# Altium footprint library devices.PCBLIB: 335 footprints (part 18 of 21)
Each footprint in its own frame and in the unit in brackets; x right, y up, seen from the top. Pads: shape width x height; smd on the part's side, far side on the other; paste and mask are expansions set on the pad; w line width, h text height; cw(c..) or ccw(c..) is an arc to the next point about the centre after c.
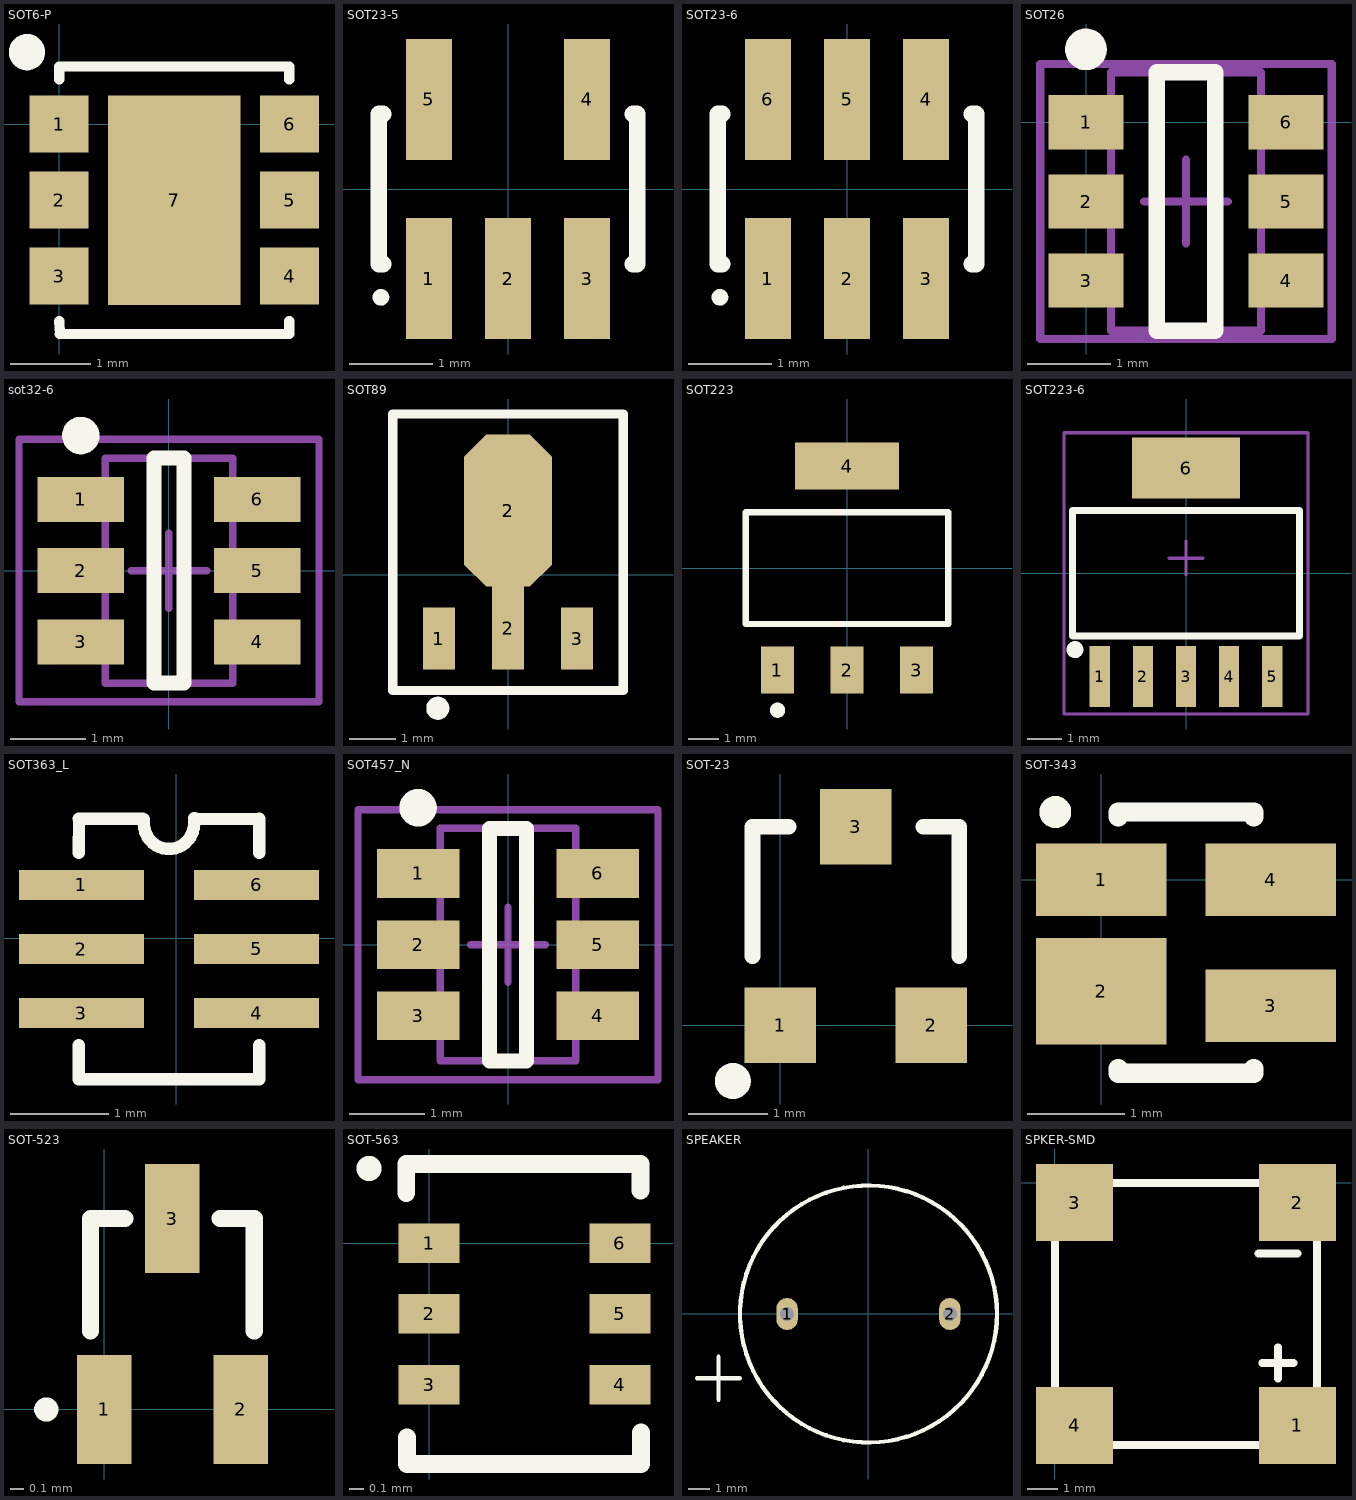
[diagram p17: the footprints below, top view; thin cyan lines are the x and y axes]

## SOT6-P [mil]
pads (7):
  rect 29x28 smd: 1(0,0) 2(0,-37.4) 3(0,-74.8) 4(113.4,-74.8) 5(113.4,-37.4) 6(113.4,0)
  rect 65x103 smd: 7(56.7,-37.4)
Top Overlay:
  circle w10: c-15.75,35.43 r3.94
  lines w5: 0.1,-96.8 0.4,-103.2 113.3,-103.2 113.3,-96.8 ; 0.1,22 0.1,28.4 113.3,28.4 113.3,22

## SOT23-5 [mm] "SOT-23/SC-74A; 5 Leads; Body 3 x 3 mm, inc. leads (LxW max)"
height 1.45
pads (5):
  rect 0.55x1.45 smd: 1(-0.95,-1.075) 2(0,-1.075) 3(0.95,-1.075) 4(0.95,1.075) 5(-0.95,1.075)
Top Overlay:
  circle w0.1: c-1.525,-1.3 r0.05
  lines w0.2: -1.5,-0.9 -1.55,-0.9 -1.55,0.9 -1.5,0.9 ; 1.5,-0.9 1.55,-0.9 1.55,0.9 1.5,0.9

## SOT23-6 [mm] "SOT-23/SC-74A; 5 Leads; Body 3.1 x 3 mm, inc. leads (LxW max)"
height 1.45
pads (6):
  rect 0.55x1.45 smd: 1(-0.95,-1.075) 2(0,-1.075) 3(0.95,-1.075) 4(0.95,1.075) 5(0,1.075) 6(-0.95,1.075)
Top Overlay:
  circle w0.1: c-1.525,-1.3 r0.05
  lines w0.2: -1.5,-0.9 -1.55,-0.9 -1.55,0.9 -1.5,0.9 ; 1.5,-0.9 1.55,-0.9 1.55,0.9 1.5,0.9

## SOT26 [mm] "SOT23, 6-Leads, Body 2.9x1.7mm, Pitch 0.95mm, Lead Span 2.8mm, IPC High Density"
height 1.45
pads (6):
  rect 0.9x0.65 smd: 1(0,0) 2(0,-0.95) 3(0,-1.9) 4(2.4,-1.9) 5(2.4,-0.95) 6(2.4,0)
Top Overlay:
  circle w0.25: c0,0.875 r0.125
  lines w0.2: 0.85,-2.5 1.55,-2.5 1.55,0.6 0.85,0.6 0.85,-2.5
Mechanical 13:
  lines w0.1: 0.3,-2.5 0.3,0.6 2.1,0.6 2.1,-2.5 0.3,-2.5
Mechanical 15:
  lines w0.1: 0.7,-0.95 1.7,-0.95 ; 1.2,-1.45 1.2,-0.45 ; -0.55,-2.6 -0.55,0.7 2.95,0.7 2.95,-2.6 -0.55,-2.6
3D body: height 1.45, standoff 0, extent 0.3,-2.5 2.1,0.6

## sot32-6 [mm] "SOT23, 6-Leads, Body 3.0x3.0mm (max), Pitch 0.95mm, IPC Medium Density"
height 1.1
pads (6):
  rect 1.15x0.6 smd: 1(-1.175,0.95) 2(-1.175,0) 3(-1.175,-0.95) 4(1.175,-0.95) 5(1.175,0) 6(1.175,0.95)
Top Overlay:
  circle w0.25: c-1.175,1.8 r0.125
  lines w0.2: -0.2,-1.5 0.2,-1.5 0.2,1.5 -0.2,1.5 -0.2,-1.5
Mechanical 13:
  lines w0.1: -0.85,-1.5 -0.85,1.5 0.85,1.5 0.85,-1.5 -0.85,-1.5
Mechanical 15:
  lines w0.1: -0.5,0 0.5,0 ; 0,-0.5 0,0.5 ; -2,-1.75 -2,1.75 2,1.75 2,-1.75 -2,-1.75
3D body: height 1.1, standoff 0.1, extent -0.85,-1.5 0.85,1.5

## SOT89 [mm] "SOT-89; Body 4.6 x 4.25 mm, inc. leads (LxW max)"
height 1.6
pads (4):
  rect 0.7x1.35 smd: 1(-1.5,-1.388) 3(1.5,-1.388)
  rect 0.7x1.8 smd: 2(0,-1.162)
  oct 1.9x3.3 smd: 2(0,1.388)
Top Overlay:
  circle w0.25: c-1.525,-2.9 r0.125
  lines w0.2: -2.5,-2.512 2.5,-2.512 2.5,3.487 -2.5,3.487 -2.5,-2.512

## SOT223 [mm] "SOT-223/SC-73; 4 Leads; Body 6.7 x 7.3 mm, inc. leads (LxW max)"
height 1.8
pads (4):
  rect 1.1x1.55 smd: 1(-2.3,-3.375) 2(0,-3.375) 3(2.3,-3.375)
  rect 3.45x1.55 smd: 4(0,3.375)
Top Overlay:
  circle w0.25: c-2.3,-4.7 r0.125
  lines w0.2: -3.35,-1.85 3.35,-1.85 3.35,1.85 -3.35,1.85 -3.35,-1.85

## SOT223-6 [mm] "SOT223, 5-Leads, Body 6.5x3.5mm, Pitch 1.5mm, Lead Span 7mm, IPC Medium Density"
height 1.8
pads (6):
  rect 0.6x1.8 smd: 1(-2.54,-3.05) 2(-1.27,-3.05) 3(0,-3.05) 4(1.27,-3.05) 5(2.54,-3.05)
  rect 3.2x1.8 smd: 6(0,3.1)
Top Overlay:
  circle w0.25: c-3.275,-2.25 r0.125
  lines w0.2: -3.35,-1.85 3.35,-1.85 3.35,1.85 -3.35,1.85 -3.35,-1.85
Mechanical 13:
  lines w0.1: -3.35,-1.85 -3.35,1.85 3.35,1.85 3.35,-1.85 ; -3.3,-1.85 3.4,-1.85
Mechanical 15:
  lines w0.1: -0.5,0.45 0.5,0.45 ; 0,-0.05 0,0.95 ; -3.6,-4.15 3.6,-4.15 3.6,4.15 -3.6,4.15 -3.6,-4.15
3D body: height 1.8, standoff 0, extent -3.3,-1.85 3.4,1.85

## SOT363_L [mil] "SOT363, 6-Leads, Body 2x1.3mm, Pitch 0.65mm, Lead Span 2.1mm, IPC High Density"
height 43.31
pads (6):
  rect 50x12 smd: 1(-37.87,21.23) 2(-37.87,-4.37) 3(-37.87,-29.97) 4(32.13,-29.97) 5(32.13,-4.37) 6(32.13,21.23)
Top Overlay:
  lines w5: -38.87,-42.87 -38.87,-56.37 33.13,-56.37 33.13,-42.87 ; -38.87,34.13 -38.87,47.63 -13.37,47.63 cw(c-13.37,47.13) -12.87,47.13 -12.87,45.63 ccw(c-2.87,45.63) 7.13,45.63 7.13,47.63 cw(c7.38,47.63) 7.63,47.63 33.13,47.63 33.13,34.13

## SOT457_N [mm] "SOT23, 6-Leads, Body 2.9x1.5mm, Pitch 0.95mm, Lead Span 2.8mm, IPC Medium Density"
height 1.1
pads (6):
  rect 1.1x0.65 smd: 1(-1.2,0.95) 2(-1.2,0) 3(-1.2,-0.95) 4(1.2,-0.95) 5(1.2,0) 6(1.2,0.95)
Top Overlay:
  circle w0.25: c-1.2,1.825 r0.125
  lines w0.2: -0.25,-1.55 -0.25,1.55 0.25,1.55 0.25,-1.55 -0.25,-1.55
Mechanical 13:
  lines w0.1: -0.9,-1.55 0.9,-1.55 0.9,1.55 -0.9,1.55 -0.9,-1.55
Mechanical 15:
  lines w0.1: -0.5,0 0.5,0 ; 0,-0.5 0,0.5 ; -2,-1.8 2,-1.8 2,1.8 -2,1.8 -2,-1.8
3D body: height 1.1, standoff 0, extent -0.9,-1.55 0.9,1.55

## SOT-23 [mm] "SOT-23; 3 Leads; Body 3.0 x 2.6 mm, inc. leads (LxW max)"
height 1.1
pads (3):
  rect 0.9x0.95 smd: 1(0,0) 2(1.9,0) 3(0.95,2.5)
Top Overlay:
  circle w0.254: c-0.6,-0.7 r0.1
  lines w0.2: -0.35,0.875 -0.35,2.5 0.1,2.5 ; 1.8,2.5 2.25,2.5 2.25,0.875
3D body: height 1, standoff 0, extent -0.495,0.024 2.425,2.364

## SOT-343 [mm] "SOT-343; 4 Leads; Body 2.2 x 2.2 mm, inc. leads (LxW max)"
height 1
pads (4):
  rect 1.35x0.75 smd: 1(0,0) 3(1.75,-1.3) 4(1.75,0)
  rect 1.35x1.1 smd: 2(0,-1.15)
Top Overlay:
  circle w0.178: c-0.476,0.7 r0.076
  lines w0.2: 0.175,-1.95 0.175,-2 1.575,-2 1.575,-1.95 ; 0.175,0.65 0.175,0.7 1.575,0.7 1.575,0.65

## SOT-523 [mm]
pads (3):
  rect 0.4x0.8 smd: 1(0,0) 2(1,0) 3(0.5,1.4)
Top Overlay:
  circle w0.127: c-0.425,0 r0.025
  lines w0.127: -0.1,0.575 -0.1,1.4 0.15,1.4 ; 0.85,1.4 1.1,1.4 1.1,0.575

## SOT-563 [mil]
pads (6):
  rect 17x11 smd: 1(0,0) 2(0,-19.69) 3(0,-39.38) 4(53.14,-39.38) 5(53.14,-19.69) 6(53.14,0)
Top Overlay:
  circle w5: c-16.71,20.8 r0.98
  lines w5: -6.36,13.98 -6.36,22.05 58.88,22.05 58.88,14.62 ; -6.18,-54.07 -6.18,-61.5 59.06,-61.5 59.06,-52.78

## SPEAKER [mm]
pads (2):
  oval 1x1.5 hole 0.65: 1(-3.796,-0.001) 2(3.804,-0.001)
Top Overlay:
  circle w0.2: c0.004,-0.001 r6
  lines w0.2: -8,-3 -6,-3 ; -7,-4 -7,-2

## SPKER-SMD [mm]
pads (4):
  rect 2.5x2.5 smd: 1(7.874,-7.874) 2(7.874,-0.635) 3(0.635,-0.635) 4(0.635,-7.874)
Top Overlay:
  lines w0.254: 6.604,-2.286 7.874,-2.286 ; 6.731,-5.842 7.747,-5.842 ; 7.239,-6.35 7.239,-5.334 ; 0,-8.509 8.509,-8.509 8.509,0 0,0 0,-8.509